# Altium integrated library OpenRex_V1I1.IntLib: 164 symbols (part 1 of 3) (continued)
## MBR140SFT1G (continued)
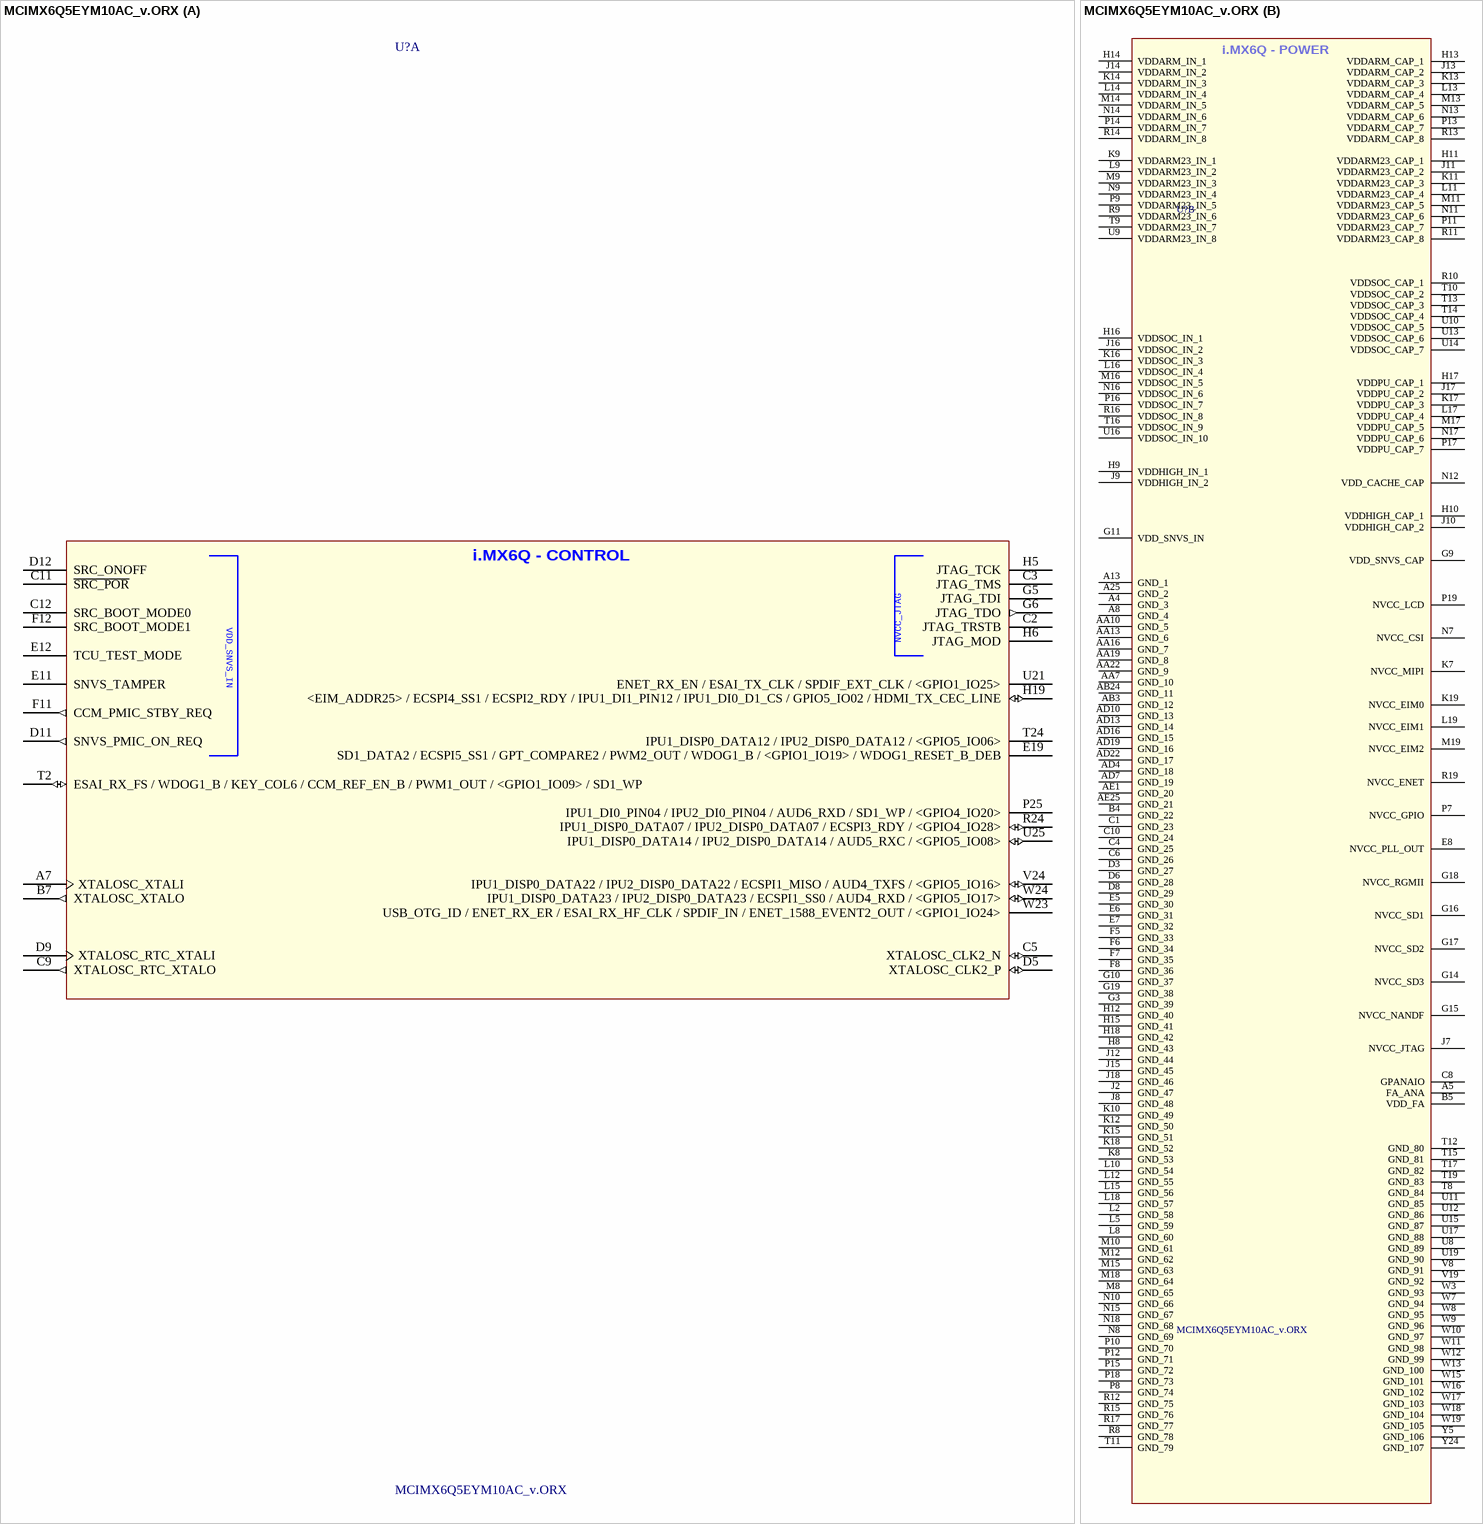
[diagram p3: symbol MCIMX6Q5EYM10AC_v.ORX]

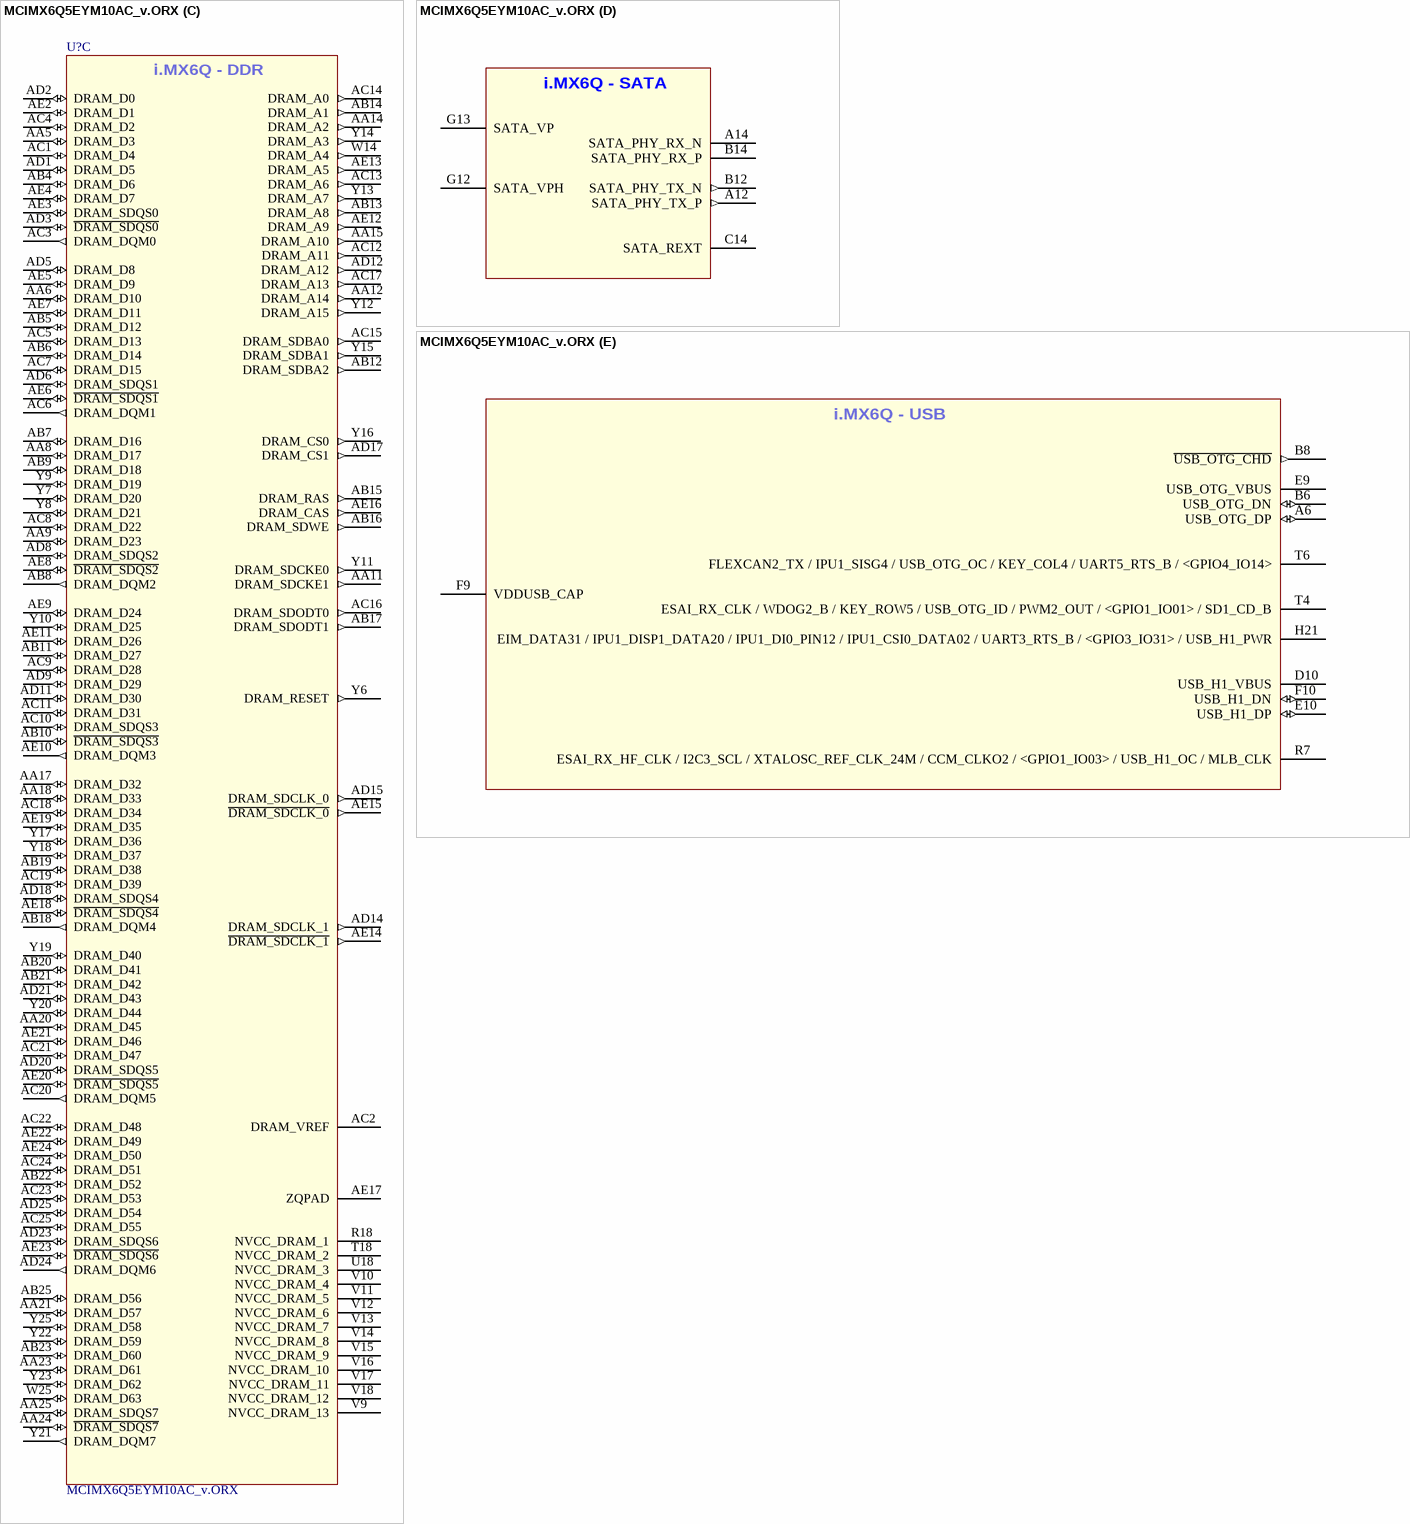
[diagram p4: symbol MCIMX6Q5EYM10AC_v.ORX]

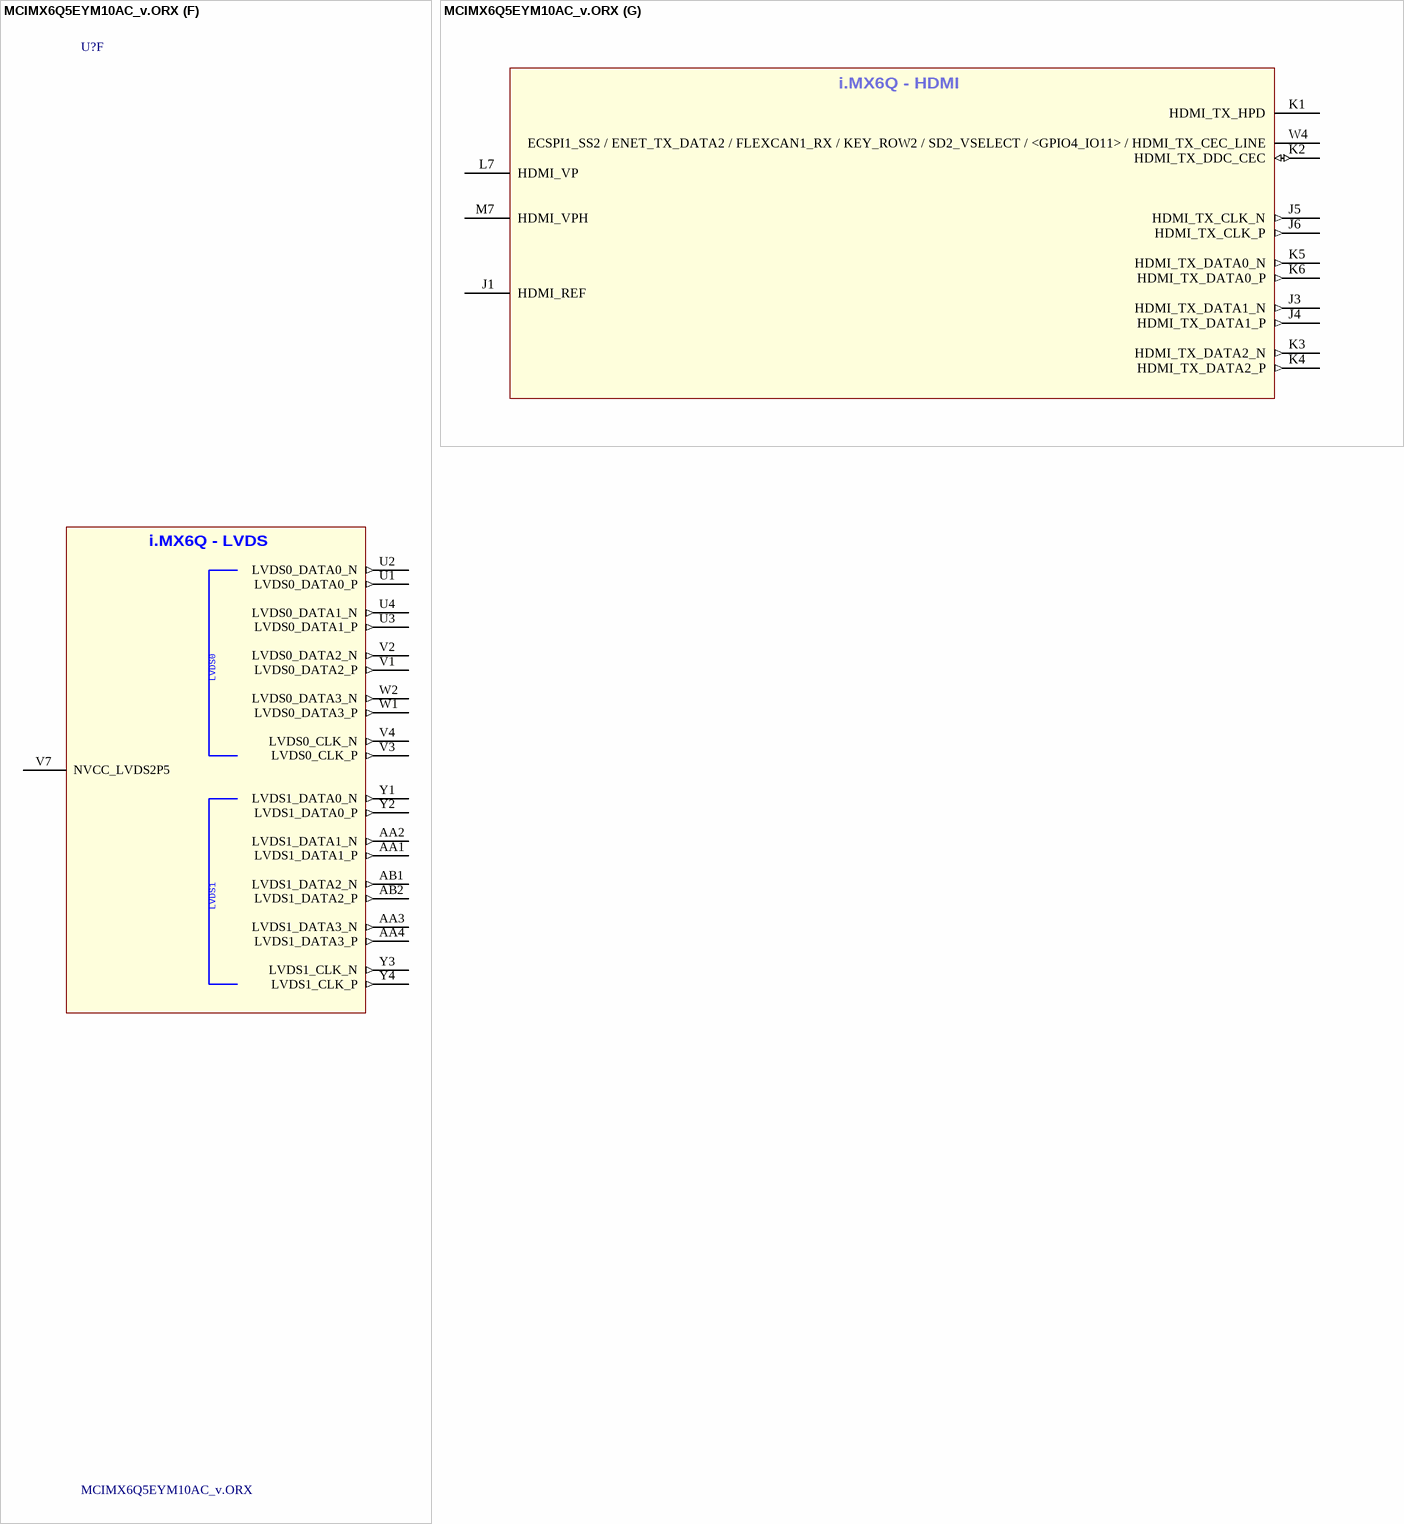
[diagram p5: symbol MCIMX6Q5EYM10AC_v.ORX]

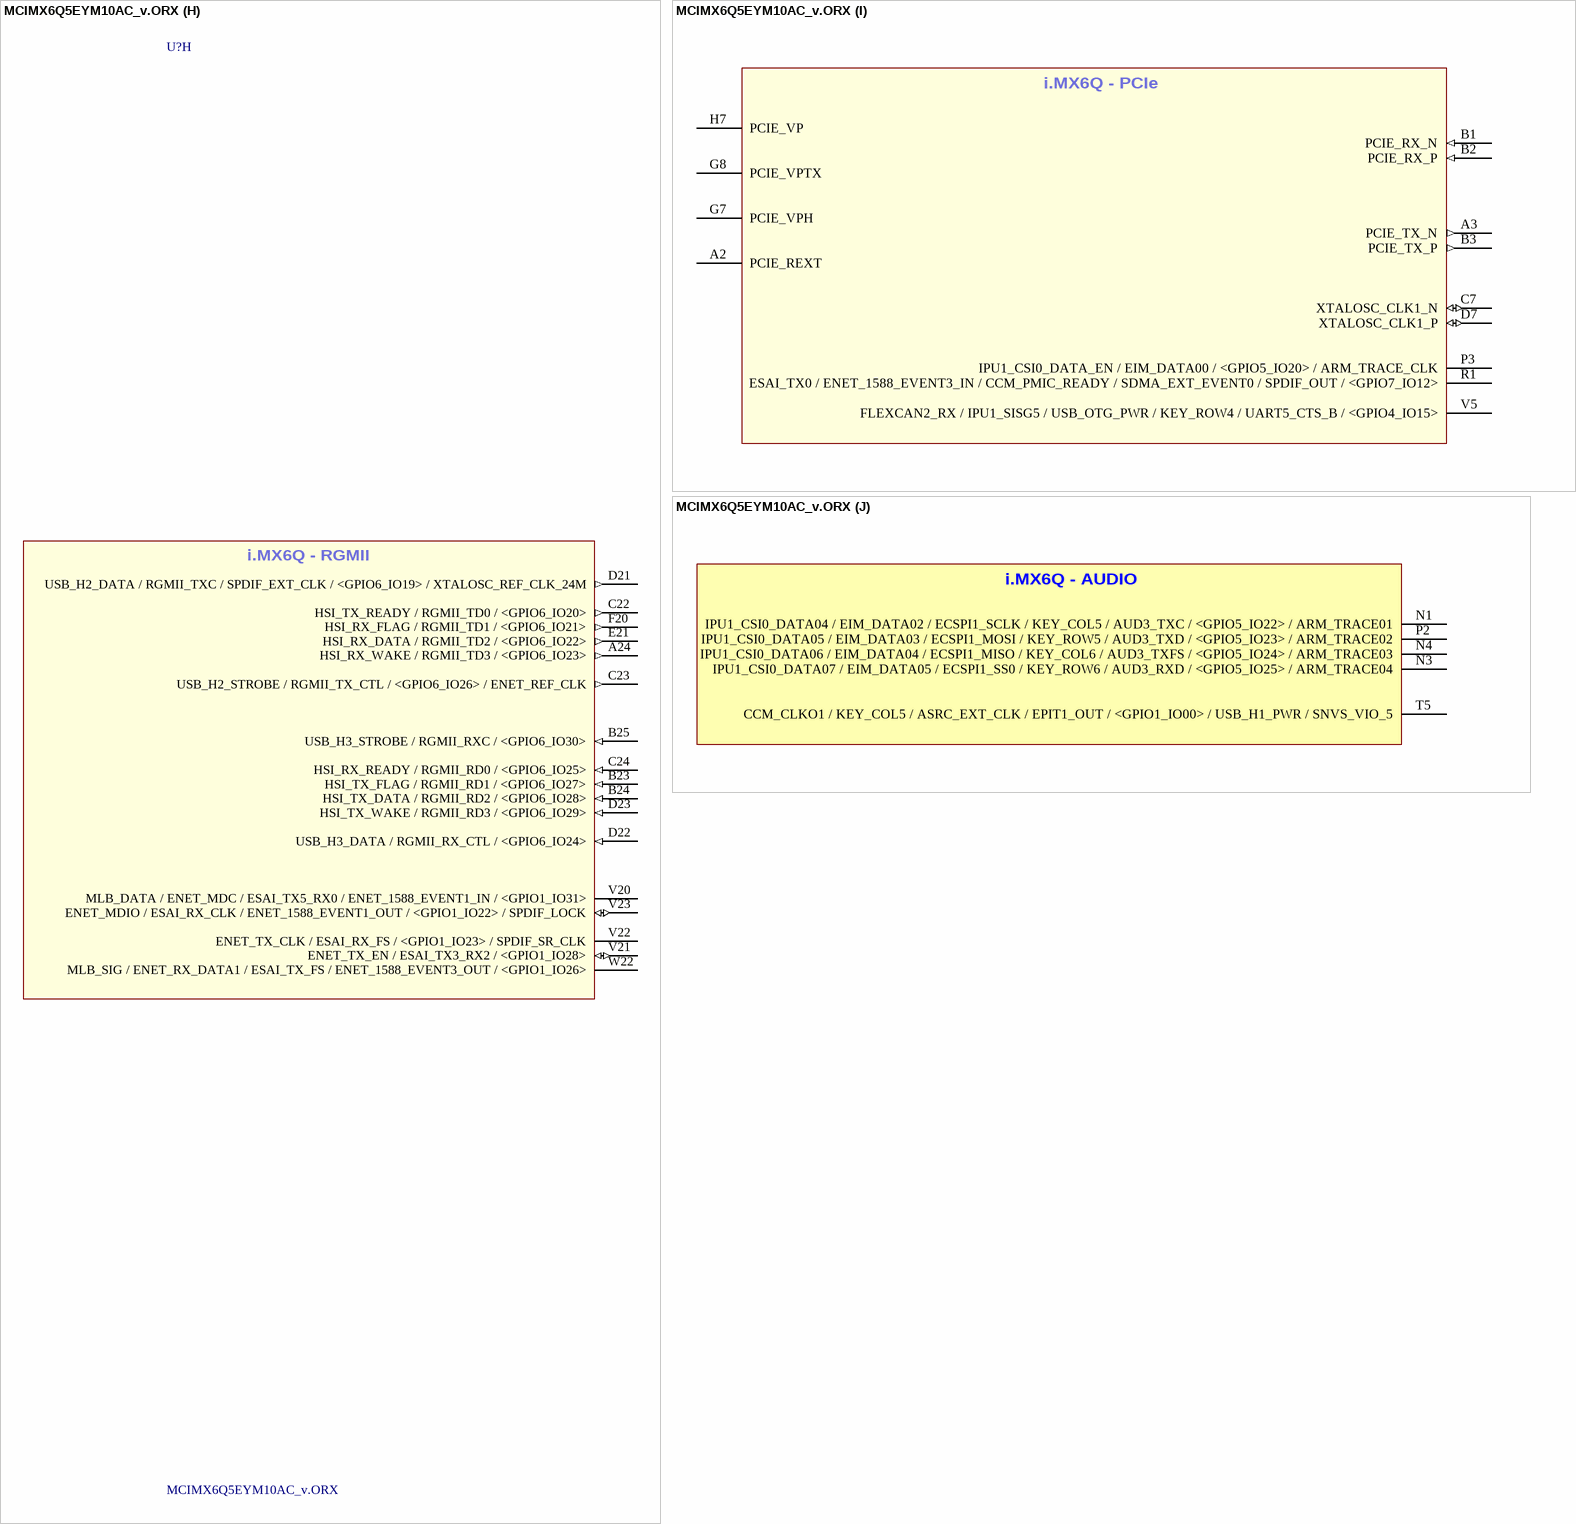
[diagram p6: symbol MCIMX6Q5EYM10AC_v.ORX]

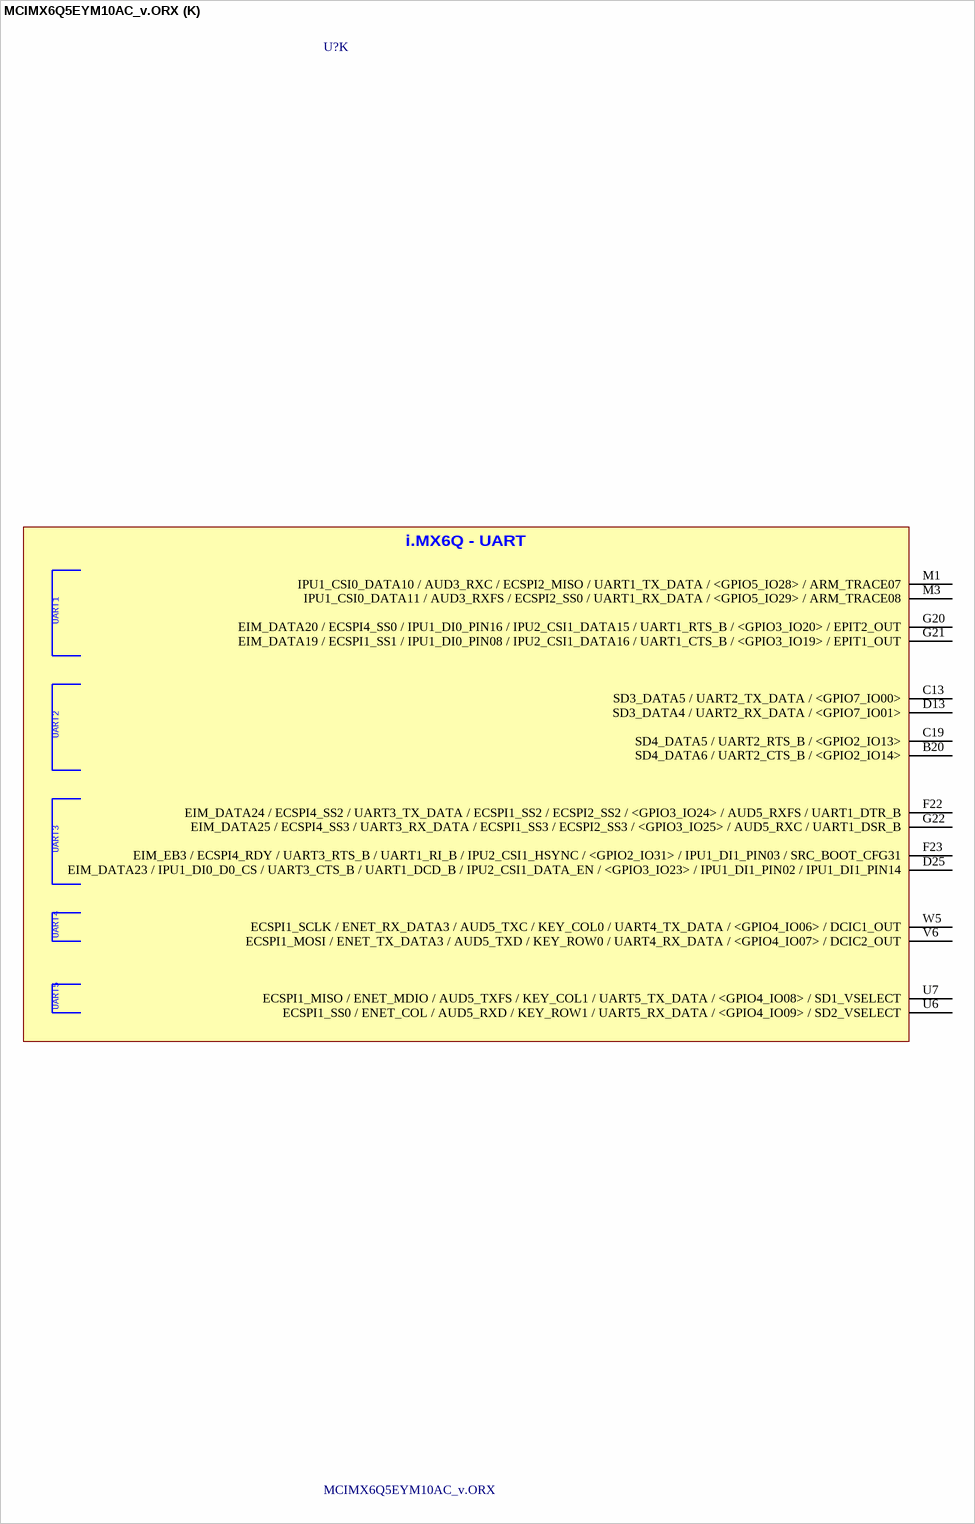
[diagram p7: symbol MCIMX6Q5EYM10AC_v.ORX]

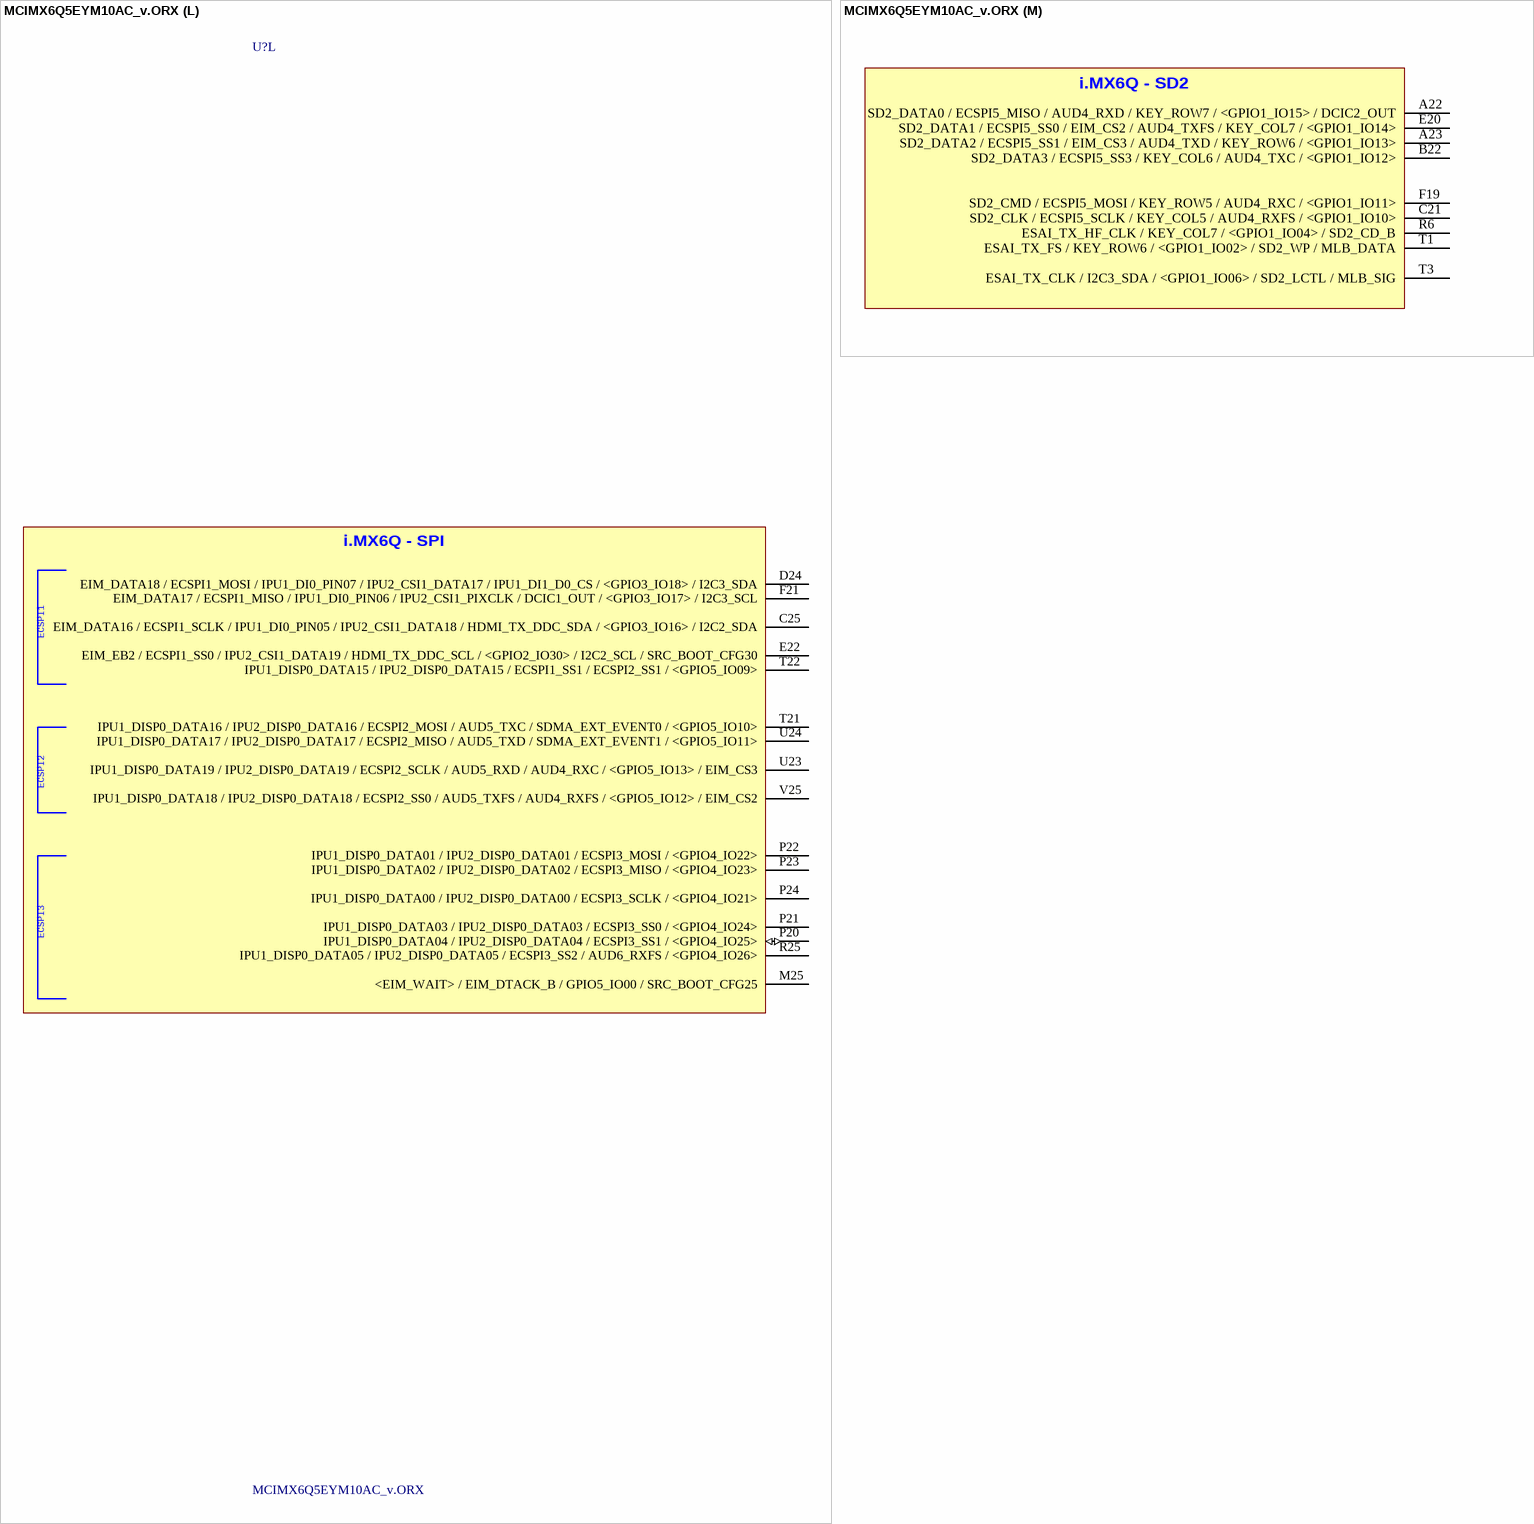
[diagram p8: symbol MCIMX6Q5EYM10AC_v.ORX]

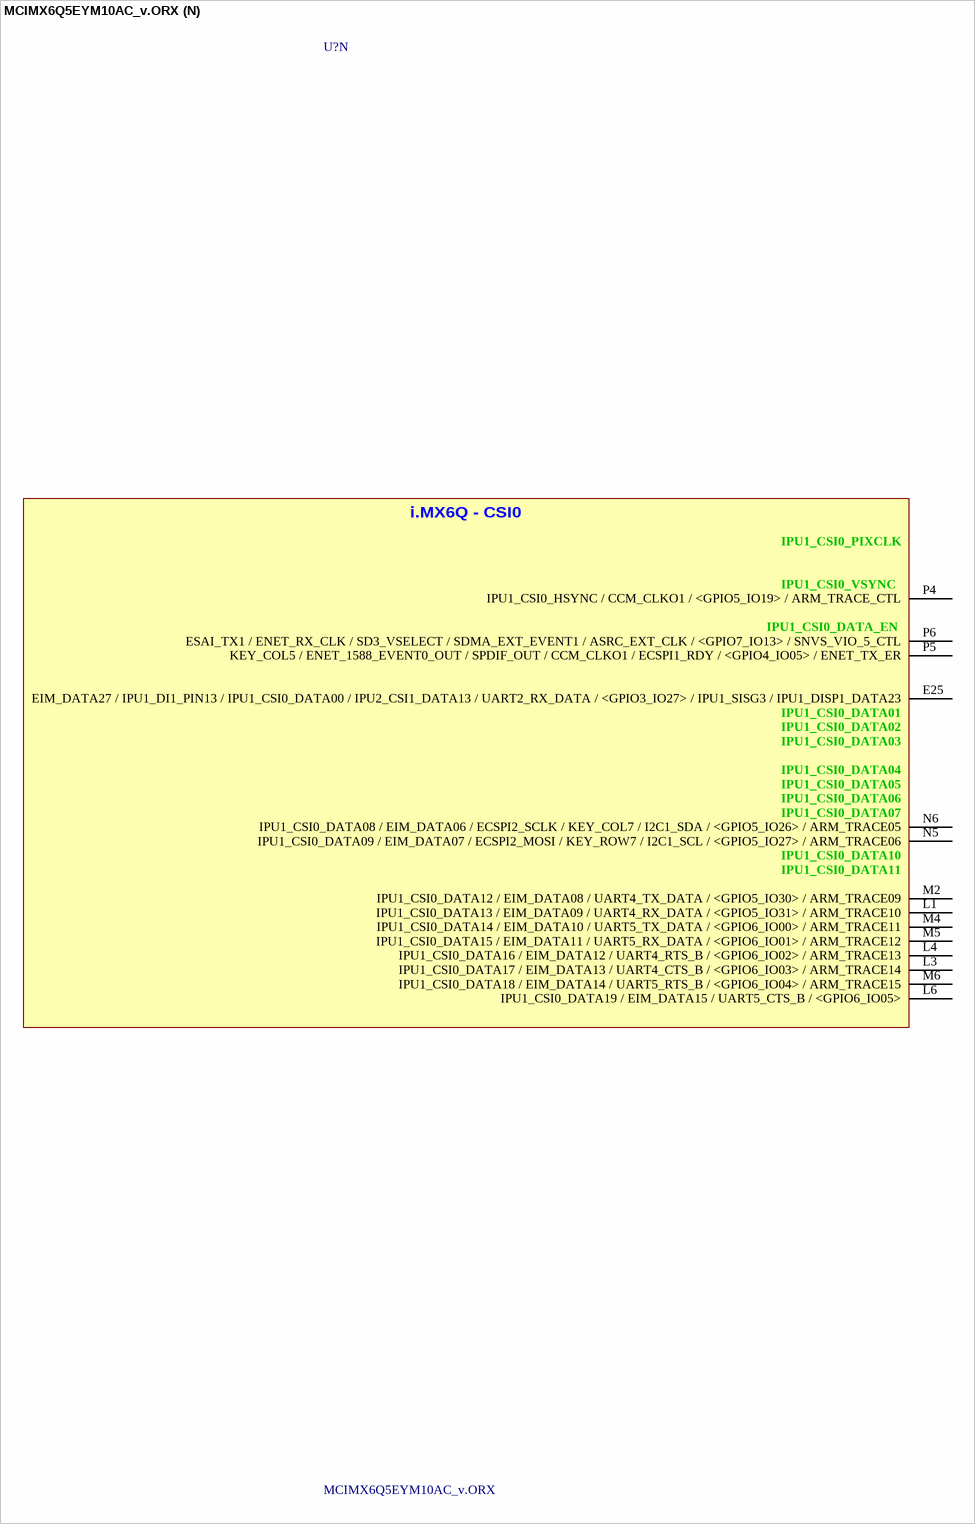
[diagram p9: symbol MCIMX6Q5EYM10AC_v.ORX]

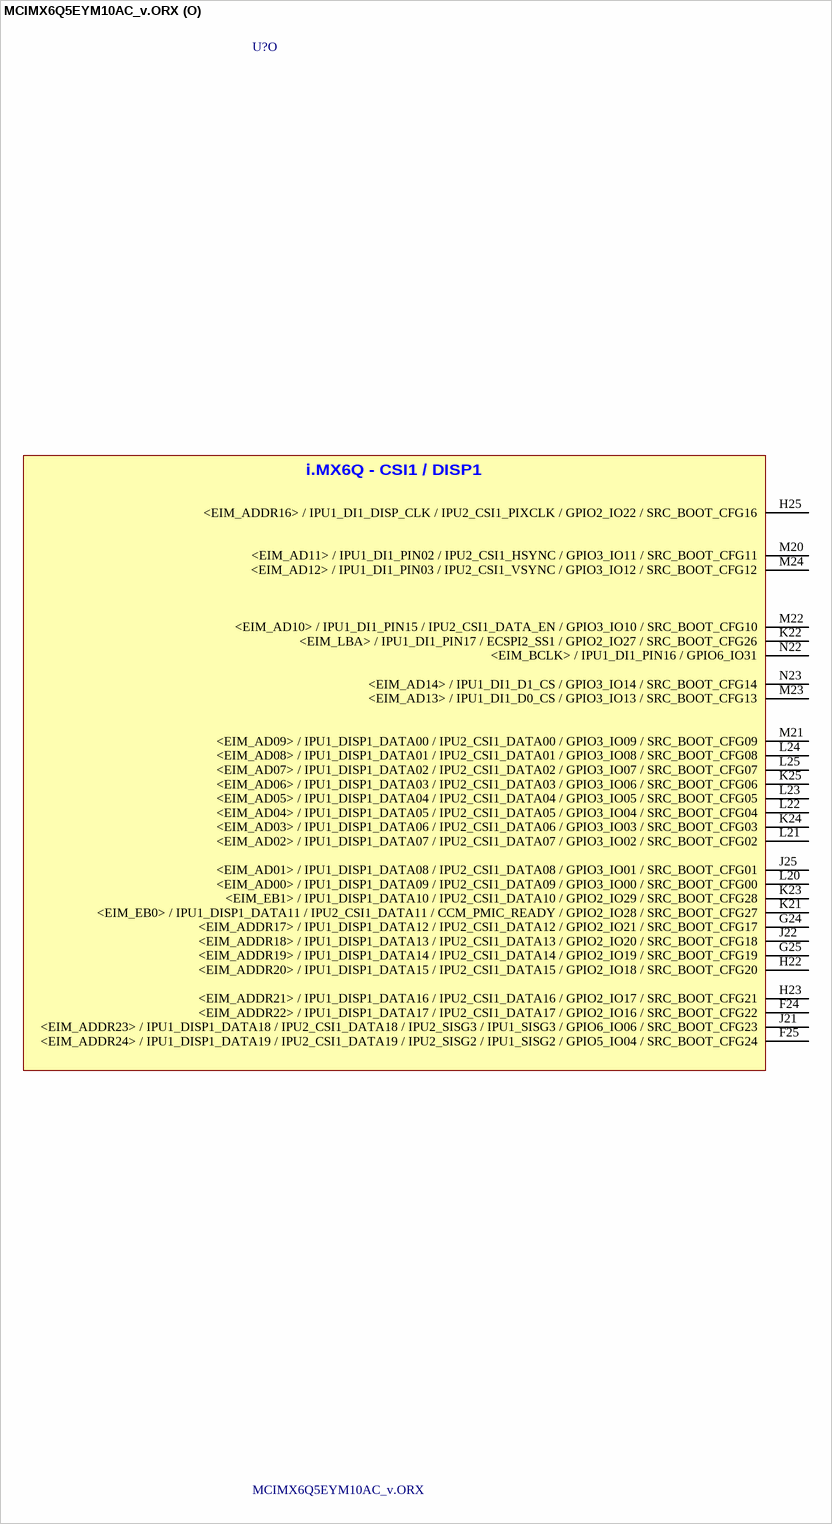
[diagram p10: symbol MCIMX6Q5EYM10AC_v.ORX]

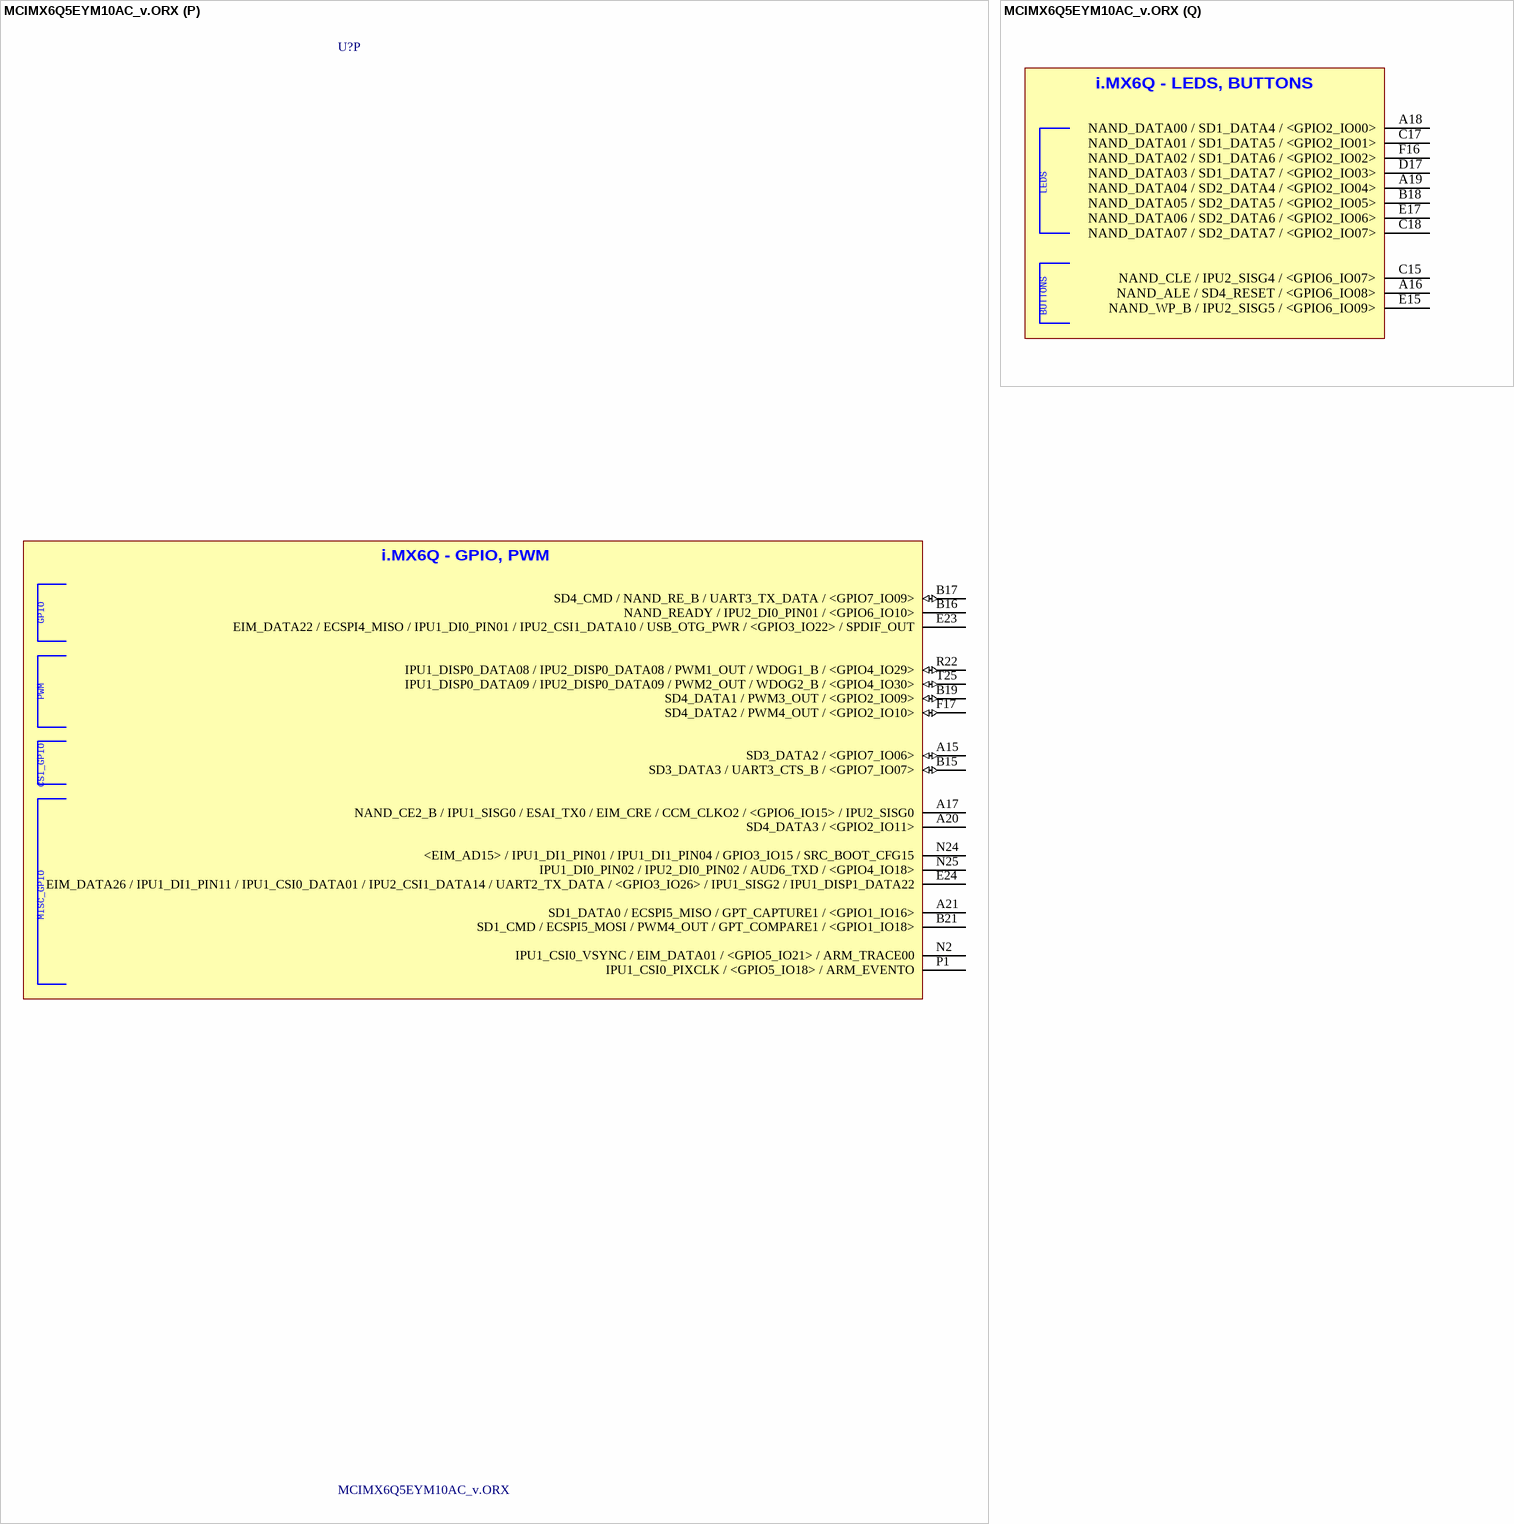
[diagram p11: symbol MCIMX6Q5EYM10AC_v.ORX]

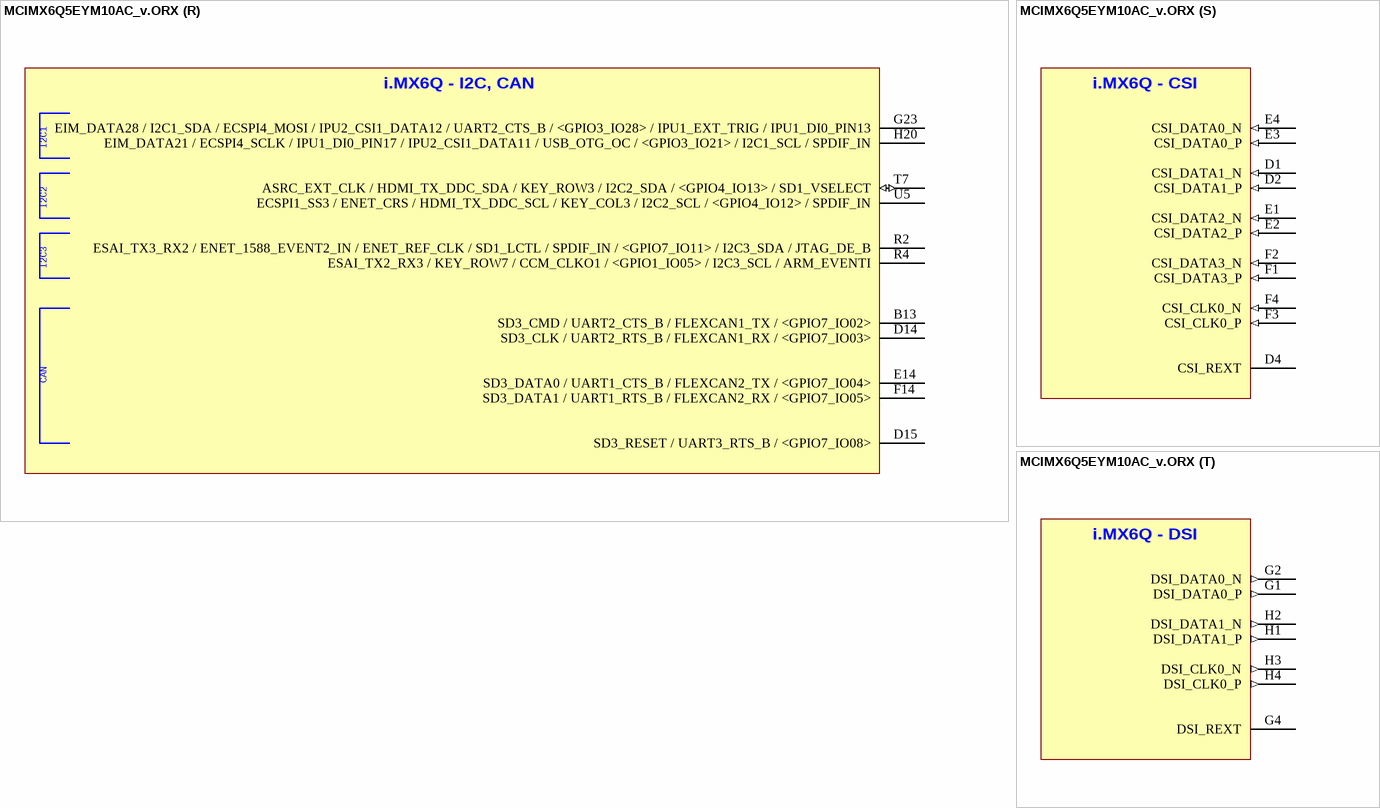
[diagram p12: symbol MCIMX6Q5EYM10AC_v.ORX]

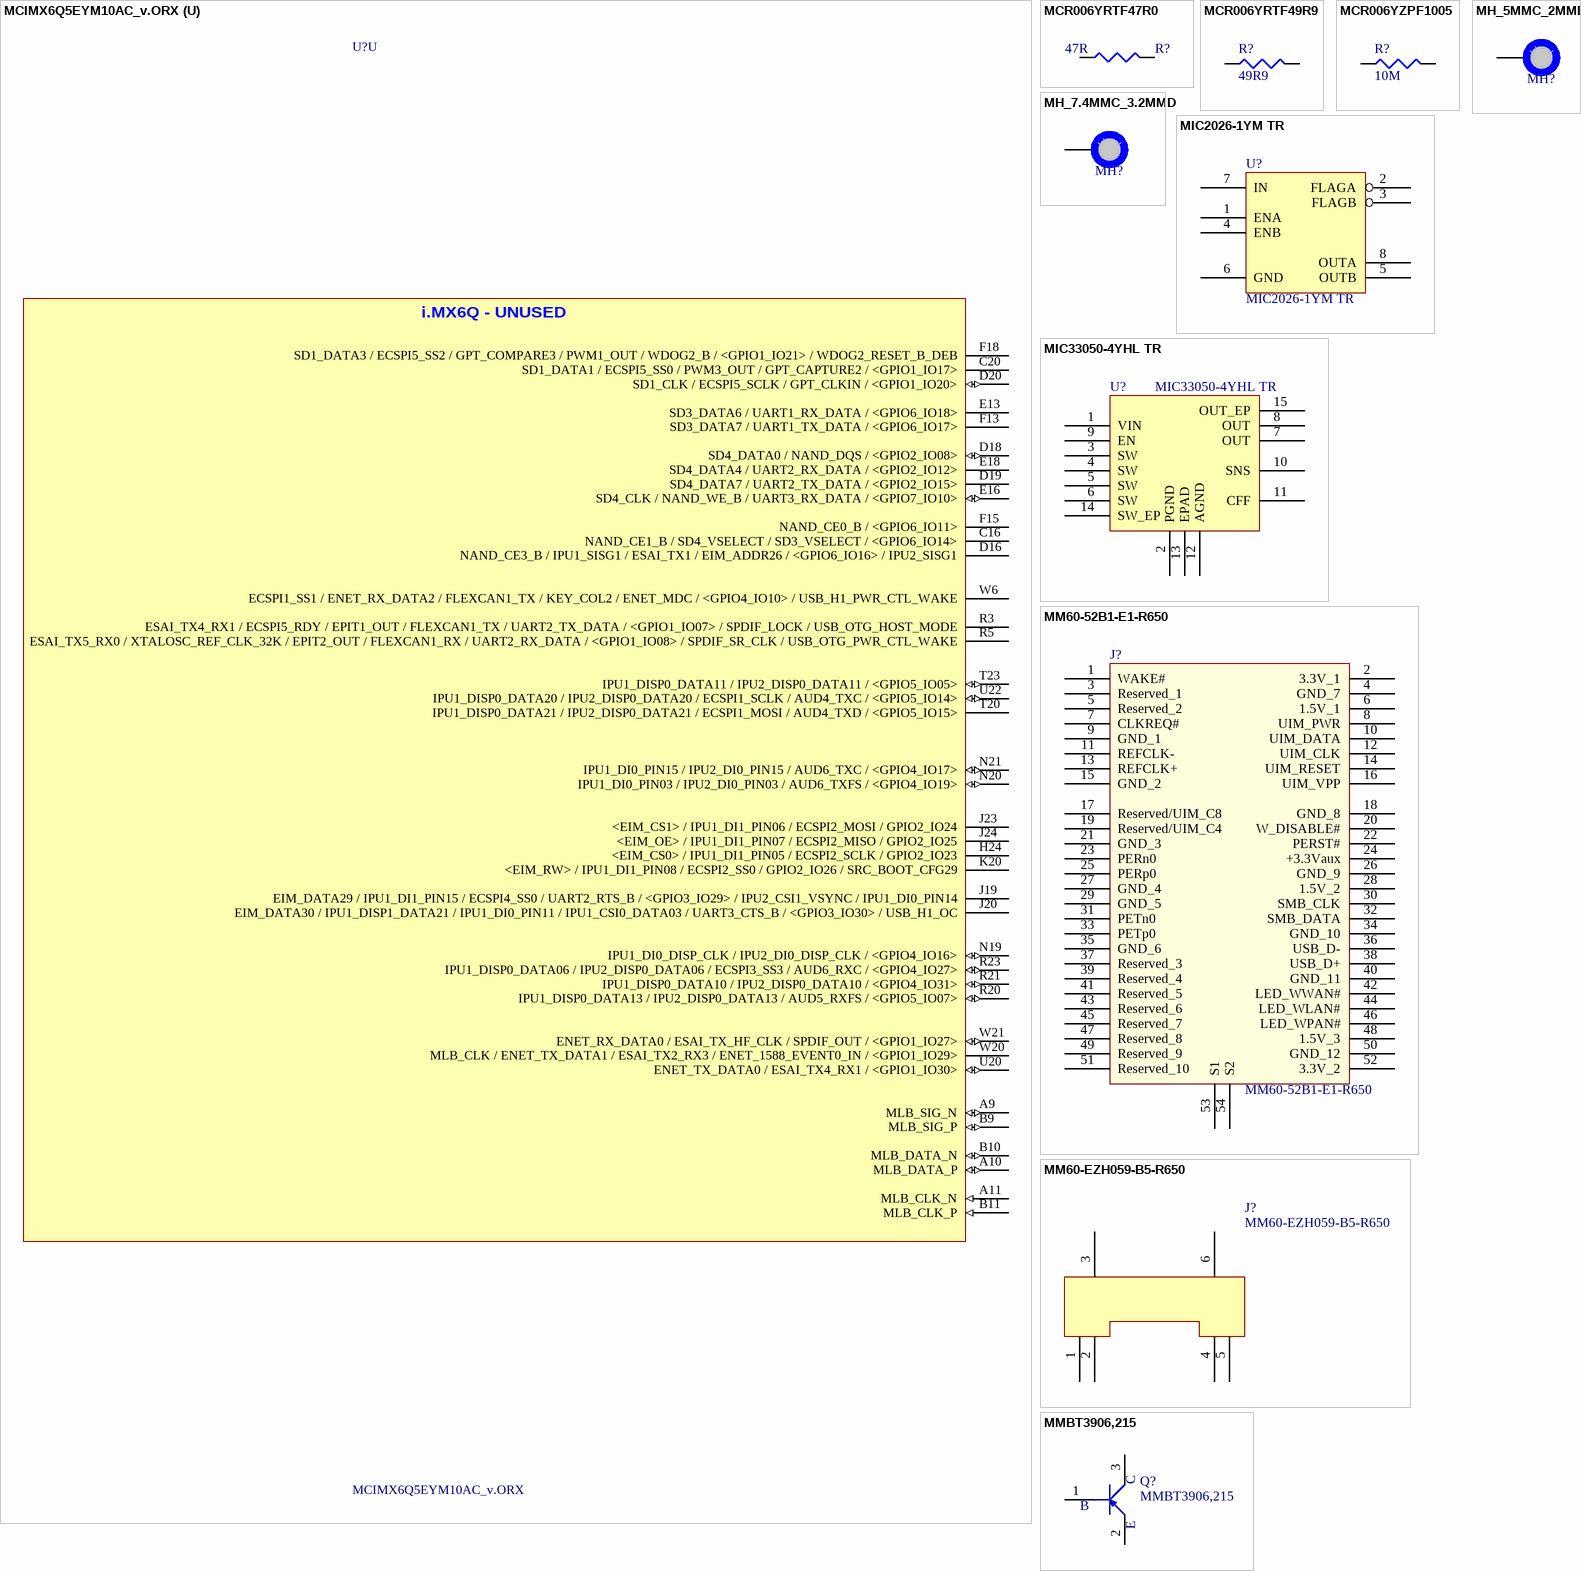
[diagram p13: symbols MCIMX6Q5EYM10AC_v.ORX to MMBT3906,215]